# Altium footprint library Integrated Circuits.PcbLib: 40 footprints (part 1 of 3)
Each footprint in its own frame and in the unit in brackets; x right, y up, seen from the top. Pads: shape width x height; smd on the part's side, far side on the other; paste and mask are expansions set on the pad; w line width, h text height; cw(c..) or ccw(c..) is an arc to the next point about the centre after c.
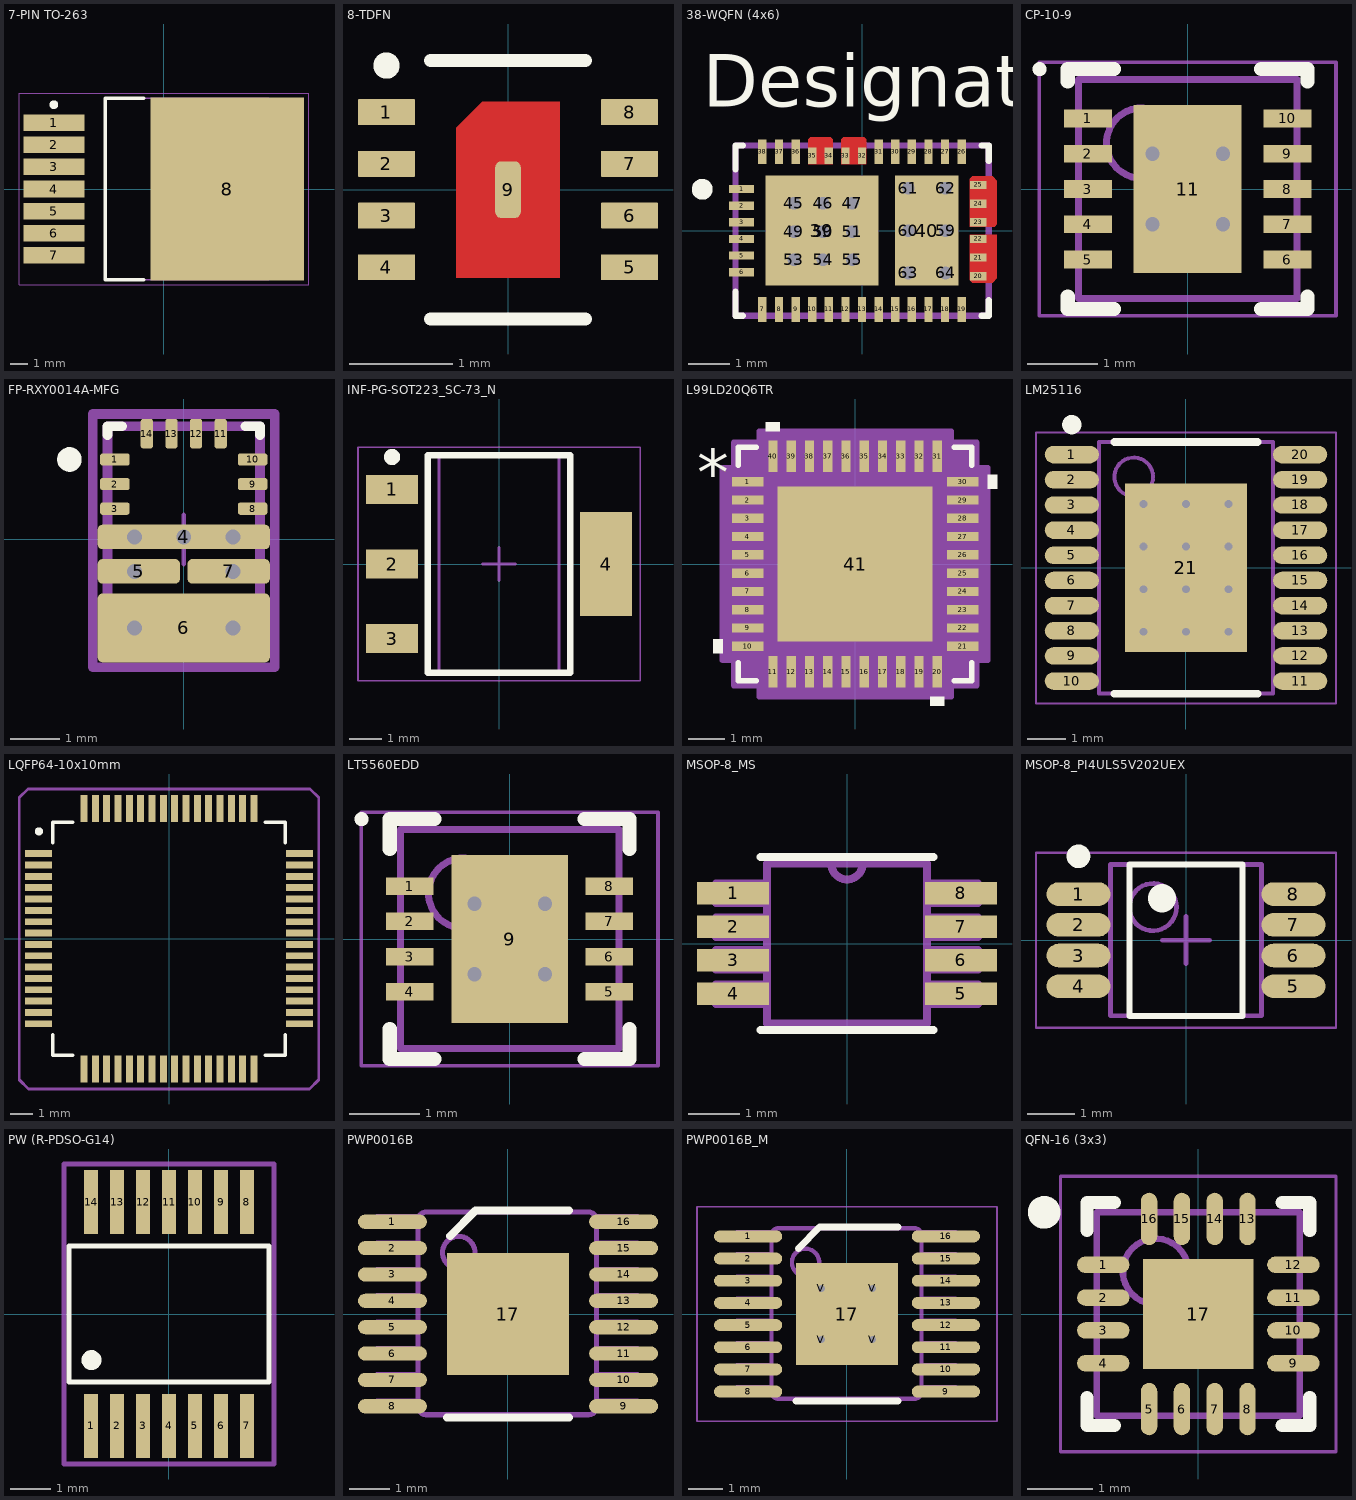
[diagram p0: the footprints below, top view; thin cyan lines are the x and y axes]

## 7-PIN TO-263 [mm] "DDPAK-7, 8-Pads, Body 7.80x8.57mm (max), IPC Medium Density"
height 4.65
pads (8):
  rect 3.5x0.95 smd: 1(-6.3,3.81) 2(-6.3,2.54) 3(-6.3,1.27) 4(-6.3,0) 5(-6.3,-1.27) 6(-6.3,-2.54) 7(-6.3,-3.81)
  rect 8.8x10.5 smd: 8(3.65,0)
Top Overlay:
  circle w0.25: c-6.3,4.835 r0.125
  lines w0.2: -1.15,-5.2 -3.35,-5.2 -3.35,5.2 -1.15,5.2
Mechanical 13:
  lines w0.1: -3.35,-5.2 -3.35,5.2 6.05,5.2 6.05,-5.2 -3.35,-5.2
Mechanical 15:
  lines w0.05: -8.3,-5.5 -8.3,5.5 8.3,5.5 8.3,-5.5 -8.3,-5.5
  lines w0.1: -0.5,0 0.5,0 ; 0,-0.5 0,0.5
3D body "7-PIN TO-263.step": height 4.65, standoff 0, extent -7.447,-5.2 7.793,5.2

## 8-TDFN [mm] "8 Pin DFN Package (2.5x2.5)"
pads (9):
  rrect5% 0.55x0.25 smd: 1(-1.175,0.75) 2(-1.175,0.25) 3(-1.175,-0.25) 4(-1.175,-0.75) 5(1.175,-0.75) 6(1.175,-0.25) 7(1.175,0.25) 8(1.175,0.75)
  rrect50% 0.25x0.55 smd: 9(0,0)
Top Layer:
  region: 0.5,-0.85 -0.5,-0.85 -0.5,0.6 -0.25,0.85 0.5,0.85
Top Overlay:
  circle w0.128: c-1.175,1.2 r0.064
  lines w0.127: -0.75,-1.25 0.75,-1.25 ; -0.75,1.25 0.75,1.25
3D body "User Library-DFN8 2_5x2_5mm.STEP": height 1.02, standoff 0, extent -1.26,-1.25 1.26,1.25

## 38-WQFN (4x6) [mm] "TPS25750DRJKR"
pads (55):
  rect 0.6x0.2 smd paste+0 mask-0.292: 1(-2.9,1) 2(-2.9,0.6) 3(-2.9,0.2) 4(-2.9,-0.2) 5(-2.9,-0.6) 6(-2.9,-1)
  rect 0.2x0.6 smd paste+0 mask-0.292: 7(-2.4,-1.9) 8(-2,-1.9) 9(-1.6,-1.9) 10(-1.2,-1.9) 11(-0.8,-1.9) 12(-0.4,-1.9) 13(0,-1.9) 14(0.4,-1.9) 15(0.8,-1.9) 16(1.2,-1.9) 17(1.6,-1.9) 18(2,-1.9) 19(2.4,-1.9) 26(2.4,1.9) 27(2,1.9) 28(1.6,1.9) 29(1.2,1.9) 30(0.8,1.9) 31(0.4,1.9) 36(-1.6,1.9) 37(-2,1.9) 38(-2.4,1.9)
  rect 0.4x0.2 smd paste-0.187 mask-0.191: 20(2.8,-1.1) 21(2.8,-0.65) 22(2.8,-0.2) 23(2.8,0.2) 24(2.8,0.65) 25(2.8,1.1)
  rect 0.2x0.4 smd paste-0.187 mask-0.191: 32(0,1.8) 33(-0.4,1.8) 34(-0.8,1.8) 35(-1.2,1.8)
  rect 2.72x2.65 smd paste-1.347 mask-1.346: 39(-0.965,0)
  rect 1.53x2.65 smd paste-1.312 mask-1.308: 40(1.56,0)
  round 0.6 / inner round 1.524 / far side round 0.6 hole 0.305 paste-2539.97 mask+0: 45(-1.64,0.655) 46(-0.94,0.655) 47(-0.24,0.655) 49(-1.64,-0.025) 50(-0.94,-0.025) 51(-0.24,-0.025) 53(-1.64,-0.705) 54(-0.94,-0.705) 55(-0.24,-0.705) 59(2.01,0) 60(1.11,0) 61(1.11,1.02) 62(2.01,1.02) 63(1.11,-1.02) 64(2.01,-1.02)
Top Layer:
  region: 2.597,0.096 2.597,1.25 2.65,1.303 3.15,1.303 3.25,1.203 3.25,0.15 3.196,0.096 2.901,0.096
  region: 2.591,-1.191 2.591,-0.097 3.25,-0.097 3.25,-1.15 3.15,-1.25 2.65,-1.25
  region: -1.3,1.6 -1.3,2.2 -1.25,2.25 -0.75,2.25 -0.7,2.2 -0.7,1.6
  region: -0.5,1.6 -0.5,2.2 -0.45,2.25 0.05,2.25 0.1,2.2 0.1,1.6
Top Overlay:
  circle w0.25: c-3.85,0.994 r0.125
  lines w0.15: -3.05,-1.475 -3.05,-2.05 -2.875,-2.05 ; -3.05,1.475 -3.05,2.05 -2.875,2.05 ; 2.875,-2.05 3.05,-2.05 3.05,-1.678 ; 2.875,2.05 3.05,2.05 3.05,1.678
  text "Designator565" at -3.835,2.984 h1.27
Top Paste:
  region: 3.15,0.1 2.9,0.1 2.65,0.1 2.6,0.15 2.6,1.203 2.65,1.253 3.15,1.253 3.2,1.203 3.2,1.05 3.15,1 2.925,1 2.875,0.95 2.875,0.8 2.925,0.75 3.15,0.75 3.2,0.7 3.2,0.6 3.15,0.55 2.925,0.55 2.875,0.5 2.875,0.35 2.925,0.3 3.15,0.3 3.2,0.25 3.2,0.15
  region: 3.15,-0.1 2.9,-0.1 2.65,-0.1 2.6,-0.15 2.6,-1.203 2.65,-1.253 3.15,-1.253 3.2,-1.203 3.2,-1.05 3.15,-1 2.925,-1 2.875,-0.95 2.875,-0.8 2.925,-0.75 3.15,-0.75 3.2,-0.7 3.2,-0.6 3.15,-0.55 2.925,-0.55 2.875,-0.5 2.875,-0.35 2.925,-0.3 3.15,-0.3 3.2,-0.25 3.2,-0.15
  region: -0.1,2.15 -0.05,2.2 0.05,2.2 0.1,2.15 0.1,1.65 0.05,1.6 -0.45,1.6 -0.5,1.65 -0.5,2.15 -0.45,2.2 -0.35,2.2 -0.3,2.15 -0.3,1.925 -0.25,1.875 -0.15,1.875 -0.1,1.925
  region: -0.9,2.15 -0.85,2.2 -0.75,2.2 -0.7,2.15 -0.7,1.65 -0.75,1.6 -1.25,1.6 -1.3,1.65 -1.3,2.15 -1.25,2.2 -1.15,2.2 -1.1,2.15 -1.1,1.925 -1.05,1.875 -0.95,1.875 -0.9,1.925
  region: -1.065,1.225 -1.065,0.155 -1.115,0.105 -2.215,0.105 -2.265,0.155 -2.265,1.225 -2.215,1.275 -1.115,1.275
  region: -2.265,-1.225 -2.265,-0.155 -2.215,-0.105 -1.115,-0.105 -1.065,-0.155 -1.065,-1.225 -1.115,-1.275 -2.215,-1.275
  region: 0.285,-1.275 -0.815,-1.275 -0.865,-1.225 -0.865,-0.155 -0.815,-0.105 0.285,-0.105 0.335,-0.155 0.335,-1.225
  region: 0.285,0.105 -0.815,0.105 -0.865,0.155 -0.865,1.225 -0.815,1.275 0.285,1.275 0.335,1.225 0.335,0.155
  region: 2.235,1.225 2.235,0.155 2.185,0.105 0.935,0.105 0.885,0.155 0.885,1.225 0.935,1.275 2.185,1.275
  region: 0.935,-0.105 2.185,-0.105 2.235,-0.155 2.235,-1.225 2.185,-1.275 0.935,-1.275 0.885,-1.225 0.885,-0.155
Top Solder:
  drawing of 34 lines, arcs and shapes, not listed
Mechanical 13:
  lines w0.15: -3.05,-2.05 3.05,-2.05 3.05,2.05 -3.05,2.05 -3.05,-2.05

## CP-10-9 [mm]
height 0.8
pads (11):
  rect 0.68x0.25 smd: 1(-1.415,1) 2(-1.415,0.5) 3(-1.415,0) 4(-1.415,-0.5) 5(-1.415,-1) 6(1.415,-1) 7(1.415,-0.5) 8(1.415,0) 9(1.415,0.5) 10(1.415,1)
  rect 1.53x2.38 smd: 11(0,0)
via -0.5,0.5 diameter 0.5 hole 0.2
via 0.5,0.5 diameter 0.5 hole 0.2
via -0.5,-0.5 diameter 0.5 hole 0.2
via 0.5,-0.5 diameter 0.5 hole 0.2
Top Overlay:
  circle w0.1: c-2.1,1.7 r0.05
  lines w0.2: -1.7,-1.525 -1.7,-1.7 -1.045,-1.7 ; -1.7,1.525 -1.7,1.7 -1.045,1.7 ; 1.045,-1.7 1.7,-1.7 1.7,-1.525 ; 1.045,1.7 1.7,1.7 1.7,1.525
Mechanical 13:
  circle w0.1: c-0.65,0.65 r0.5
  lines w0.1: -1.55,-1.55 -1.55,1.55 1.55,1.55 1.55,-1.55 -1.55,-1.55
Mechanical 15:
  lines w0.05: -2.105,-1.8 -2.105,1.8 2.105,1.8 2.105,-1.8 -2.105,-1.8
  lines w0.1: -0.5,0 0.5,0 ; 0,-0.5 0,0.5
3D body "CP-10-9.step": height 0.8, standoff 0, extent -1.57,-1.55 1.57,1.55

## FP-RXY0014A-MFG [mm]
pads (14):
  rrect40% 0.6x0.25 smd paste+0 mask-1000: 1(-1.4,1.625) 2(-1.4,1.125) 3(-1.4,0.625) 8(1.4,0.625) 9(1.4,1.125) 10(1.4,1.625)
  rrect40% 3.5x0.5 smd paste-1000 mask-1000: 4(0,0.05)
  rrect40% 1.675x0.5 smd paste-1000 mask-1000: 5(-0.913,-0.65) 7(0.913,-0.65)
  rrect14% 3.5x1.4 smd paste-1000 mask-1000: 6(0,-1.8)
  rrect40% 0.25x0.6 smd paste+0 mask-1000: 11(0.75,2.15) 12(0.25,2.15) 13(-0.25,2.15) 14(-0.75,2.15)
via 1,-1.8 diameter 0.5 hole 0.3
via -1,-0.65 diameter 0.5 hole 0.3
via -1,-1.8 diameter 0.5 hole 0.3
via 1,-0.65 diameter 0.5 hole 0.3
via 1,0.05 diameter 0.5 hole 0.3
via 0,0.05 diameter 0.5 hole 0.3
via -1,0.05 diameter 0.5 hole 0.3
Top Overlay:
  circle w0.25: c-2.325,1.625 r0.125
  lines w0.2: -1.55,2.125 -1.55,2.3 -1.25,2.3 ; 1.25,2.3 1.55,2.3 1.55,2.125
Top Paste:
  drawing of 10 lines, arcs and shapes, not listed
Top Solder:
  drawing of 14 lines, arcs and shapes, not listed
Top 3D Body:
  lines w0.2: -1.55,-2.3 -1.55,2.3 1.55,2.3 1.55,-2.3 -1.55,-2.3
Top Assembly:
  lines w0.2: -1.85,-2.6 -1.85,2.55 1.85,2.55 1.85,-2.6 -1.85,-2.6
  text ".Designator" at 0,0.162 h1
Top Courtyard:
  lines w0.2: -1.85,-2.6 -1.85,2.55 1.85,2.55 1.85,-2.6 -1.85,-2.6
Top Component Center:
  lines w0.1: -0.5,0 0.5,0 ; 0,-0.5 0,0.5
3D body "IC_Texas_Instruments_DRV8243HQRXYRQ1_eec.STEP": height 0.25, standoff 0, extent -1.85,-2.6 1.85,2.55

## INF-PG-SOT223_SC-73_N [mm] "SOT223, 4-Leads, Body 6.5x3.5mm, Pitch 2.3mm, IPC Medium Density"
height 1.8
pads (4):
  rect 1.6x0.9 smd: 1(-3.3,2.3) 2(-3.3,0) 3(-3.3,-2.3)
  rect 1.6x3.2 smd: 4(3.3,0)
Top Overlay:
  circle w0.25: c-3.3,3.3 r0.125
  lines w0.2: -2.2,-3.35 -2.2,3.35 2.2,3.35 2.2,-3.35 -2.2,-3.35
Mechanical 13:
  lines w0.1: -1.85,-3.35 -1.85,3.35 1.85,3.35 1.85,-3.35 -1.85,-3.35
Mechanical 15:
  lines w0.05: -4.35,-3.6 -4.35,3.6 4.35,3.6 4.35,-3.6 -4.35,-3.6
  lines w0.1: -0.5,0 0.5,0 ; 0,-0.5 0,0.5
3D body: height 1.8, standoff 0.1, extent -1.85,-3.35 1.85,3.35

## L99LD20Q6TR [mil] "IC LED DRVR RGLTR PWM 1.5A 40QFN"
pads (41):
  rect 34x10 smd paste+0 mask+0: 1(-116,88.61) 2(-116,68.92) 3(-116,49.23) 4(-116,29.54) 5(-116,9.85) 6(-116,-9.85) 7(-116,-29.54) 8(-116,-49.23) 9(-116,-68.92) 10(-116,-88.61) 21(116,-88.61) 22(116,-68.92) 23(116,-49.23) 24(116,-29.54) 25(116,-9.85) 26(116,9.85) 27(116,29.54) 28(116,49.23) 29(116,68.92) 30(116,88.61)
  rect 10x34 smd paste+0 mask+0: 11(-88.61,-116) 12(-68.92,-116) 13(-49.23,-116) 14(-29.54,-116) 15(-9.85,-116) 16(9.85,-116) 17(29.54,-116) 18(49.23,-116) 19(68.92,-116) 20(88.61,-116) 31(88.61,116) 32(68.92,116) 33(49.23,116) 34(29.54,116) 35(9.85,116) 36(-9.85,116) 37(-29.54,116) 38(-49.23,116) 39(-68.92,116) 40(-88.61,116)
  rect 167x167 smd paste-83 mask+0: 41(0,0)
Top Overlay:
  region: -143,-81.11 -153,-81.11 -153,-96.11 -143,-96.11
  region: 96.11,-143 81.11,-143 81.11,-153 96.11,-153
  region: 143,96.11 153,96.11 153,81.11 143,81.11
  region: -81.11,143 -96.11,143 -96.11,153 -81.11,153
  lines w6: -126,-106.7 -126,-126 -106.7,-126 ; -126,106.7 -126,126 -106.7,126 ; 106.7,-126 126,-126 126,-106.7 ; 106.7,126 126,126 126,106.7
  text "*" at -170.5,73.45 h50
Top Paste:
  region: -31.77,79.56 -79.56,79.56 -79.56,31.77 -31.77,31.77
  region: -31.77,23.9 -79.56,23.9 -79.56,-23.9 -31.77,-23.9
  region: -31.77,-31.77 -79.56,-31.77 -79.56,-79.56 -31.77,-79.56
  region: 23.9,79.56 -23.9,79.56 -23.9,31.77 23.9,31.77
  region: 23.9,23.9 -23.9,23.9 -23.9,-23.9 23.9,-23.9
  region: 23.9,-31.77 -23.9,-31.77 -23.9,-79.56 23.9,-79.56
  region: 79.56,79.56 31.77,79.56 31.77,31.77 79.56,31.77
  region: 79.56,23.9 31.77,23.9 31.77,-23.9 79.56,-23.9
  region: 79.56,-31.77 31.77,-31.77 31.77,-79.56 79.56,-79.56
Mechanical 13:
  lines w1: -121,71 -71,121 ; -121,-121 121,-121 121,121 -121,121 -121,-121 ; -121,-94.61 -121,-82.61 -121,-94.61 ; -121,-74.92 -121,-62.91 -121,-74.92 ; -121,-55.23 -121,-43.23 -121,-55.23 ; -121,-35.53 -121,-23.54 -121,-35.53 ; -121,-15.85 -121,-3.85 -121,-15.85 ; -121,3.85 -121,15.85 -121,3.85 ; -121,23.54 -121,35.53 -121,23.54 ; -121,43.23 -121,55.23 -121,43.23 ; -121,62.91 -121,74.92 -121,62.91 ; -121,82.61 -121,94.61 -121,82.61 ; -94.61,-121 -82.61,-121 -94.61,-121 ; -94.61,121 -82.61,121 -94.61,121 ; -74.92,-121 -62.91,-121 -74.92,-121 ; -74.92,121 -62.91,121 -74.92,121 ; -55.23,-121 -43.23,-121 -55.23,-121 ; -55.23,121 -43.23,121 -55.23,121 ; -35.53,-121 -23.54,-121 -35.53,-121 ; -35.53,121 -23.54,121 -35.53,121 ; -15.85,-121 -3.85,-121 -15.85,-121 ; -15.85,121 -3.85,121 -15.85,121 ; 3.85,-121 15.85,-121 3.85,-121 ; 3.85,121 15.85,121 3.85,121 ; 23.54,-121 35.53,-121 23.54,-121 ; 23.54,121 35.53,121 23.54,121 ; 43.23,-121 55.23,-121 43.23,-121 ; 43.23,121 55.23,121 43.23,121 ; 62.91,-121 74.92,-121 62.91,-121 ; 62.91,121 74.92,121 62.91,121 ; 82.61,-121 94.61,-121 82.61,-121 ; 82.61,121 94.61,121 82.61,121 ; 121,-94.61 121,-82.61 121,-94.61 ; 121,-74.92 121,-62.91 121,-74.92 ; 121,-55.23 121,-43.23 121,-55.23 ; 121,-35.53 121,-23.54 121,-35.53 ; 121,-15.85 121,-3.85 121,-15.85 ; 121,3.85 121,15.85 121,3.85 ; 121,23.54 121,35.53 121,23.54 ; 121,43.23 121,55.23 121,43.23 ; 121,62.91 121,74.92 121,62.91 ; 121,82.61 121,94.61 121,82.61
  text "*" at -111.5,73.45 h50
Mechanical 15:
  region: -103.61,-131 -131,-131 -131,-103.61 -143,-103.61 -143,103.61 -131,103.61 -131,131 -103.61,131 -103.61,143 103.61,143 103.61,131 131,131 131,103.61 143,103.61 143,-103.61 131,-103.61 131,-131 103.61,-131 103.61,-143 -103.61,-143
  lines w6: -143,-103.61 -131,-103.61 -131,-131 -103.61,-131 -103.61,-143 103.61,-143 103.61,-131 131,-131 131,-103.61 143,-103.61 143,103.61 131,103.61 131,131 103.61,131 103.61,143 -103.61,143 -103.61,131 -131,131 -131,103.61 -143,103.61 -143,-103.61
3D body "QFN40L_6P15X6P15X0P5_STM.step": height 41.1, standoff 0, extent -120.98,-120.98 120.98,120.98

## LM25116 [mm] "IC REG CTRLR BUCK 20TSSOP"
height 1.1
pads (21):
  oval 1.4x0.45 smd: 1(-2.95,2.925) 2(-2.95,2.275) 3(-2.95,1.625) 4(-2.95,0.975) 5(-2.95,0.325) 6(-2.95,-0.325) 7(-2.95,-0.975) 8(-2.95,-1.625) 9(-2.95,-2.275) 10(-2.95,-2.925) 11(2.95,-2.925) 12(2.95,-2.275) 13(2.95,-1.625) 14(2.95,-0.975) 15(2.95,-0.325) 16(2.95,0.325) 17(2.95,0.975) 18(2.95,1.625) 19(2.95,2.275) 20(2.95,2.925)
  rect 3.15x4.35 smd: 21(0,0)
via -1.1,1.65 diameter 0.5 hole 0.2
via 0,1.65 diameter 0.5 hole 0.2
via 1.1,1.65 diameter 0.5 hole 0.2
via -1.1,0.55 diameter 0.5 hole 0.2
via 0,0.55 diameter 0.5 hole 0.2
via 1.1,0.55 diameter 0.5 hole 0.2
via -1.1,-0.55 diameter 0.5 hole 0.2
via 0,-0.55 diameter 0.5 hole 0.2
via 1.1,-0.55 diameter 0.5 hole 0.2
via -1.1,-1.65 diameter 0.5 hole 0.2
via 0,-1.65 diameter 0.5 hole 0.2
via 1.1,-1.65 diameter 0.5 hole 0.2
Top Overlay:
  circle w0.25: c-2.95,3.7 r0.125
  lines w0.2: -1.85,-3.25 1.85,-3.25 ; -1.85,3.25 1.85,3.25
Mechanical 13:
  circle w0.1: c-1.35,2.35 r0.5
  lines w0.1: -2.25,-3.25 -2.25,3.25 2.25,3.25 2.25,-3.25 -2.25,-3.25
Mechanical 15:
  lines w0.05: -3.875,-3.5 -3.875,3.5 3.875,3.5 3.875,-3.5 -3.875,-3.5
  lines w0.1: -0.5,0 0.5,0 ; 0,-0.5 0,0.5
3D body "LM25116.step": height 1.1, standoff 0, extent -3.2,-3.25 3.2,3.25

## LQFP64-10x10mm [mm]
pads (64):
  rect 1.194x0.305 smd paste+0 mask+0.102: 1(-5.75,3.75) 2(-5.75,3.25) 3(-5.75,2.75) 4(-5.75,2.25) 5(-5.75,1.75) 6(-5.75,1.25) 7(-5.75,0.75) 8(-5.75,0.25) 9(-5.75,-0.25) 10(-5.75,-0.75) 11(-5.75,-1.25) 12(-5.75,-1.75) 13(-5.75,-2.25) 14(-5.75,-2.75) 15(-5.75,-3.25) 16(-5.75,-3.75) 33(5.75,-3.75) 34(5.75,-3.25) 35(5.75,-2.75) 36(5.75,-2.25) 37(5.75,-1.75) 38(5.75,-1.25) 39(5.75,-0.75) 40(5.75,-0.25) 41(5.75,0.25) 42(5.75,0.75) 43(5.75,1.25) 44(5.75,1.75) 45(5.75,2.25) 46(5.75,2.75) 47(5.75,3.25) 48(5.75,3.75)
  rect 0.305x1.194 smd paste+0 mask+0.102: 17(-3.75,-5.75) 18(-3.25,-5.75) 19(-2.75,-5.75) 20(-2.25,-5.75) 21(-1.75,-5.75) 22(-1.25,-5.75) 23(-0.75,-5.75) 24(-0.25,-5.75) 25(0.25,-5.75) 26(0.75,-5.75) 27(1.25,-5.75) 28(1.75,-5.75) 29(2.25,-5.75) 30(2.75,-5.75) 31(3.25,-5.75) 32(3.75,-5.75) 49(3.75,5.75) 50(3.25,5.75) 51(2.75,5.75) 52(2.25,5.75) 53(1.75,5.75) 54(1.25,5.75) 55(0.75,5.75) 56(0.25,5.75) 57(-0.25,5.75) 58(-0.75,5.75) 59(-1.25,5.75) 60(-1.75,5.75) 61(-2.25,5.75) 62(-2.75,5.75) 63(-3.25,5.75) 64(-3.75,5.75)
Top Overlay:
  circle w0.254: c-5.738,4.735 r0.051
  lines w0.152: -5.131,-4.234 -5.131,-5.131 -4.234,-5.131 ; -5.131,4.234 -5.131,5.131 -4.234,5.131 ; 4.234,-5.131 5.131,-5.131 5.131,-4.234 ; 4.234,5.131 5.131,5.131 5.131,4.234
Boundary:
  lines w0.127: -6.604,-6.223 -6.198,-6.629 6.198,-6.629 6.604,-6.223 6.604,6.223 6.223,6.604 -6.223,6.604 -6.604,6.223 -6.604,-6.223
3D body: height 0.25, standoff 0, extent 0,0 0.254,0.254
3D body "LQFP64-10x10mm.step": height 1.6, standoff 0, extent -5.997,-5.997 5.997,5.997

## LT5560EDD [mm] "SON, 8-Leads, Body 3.00x3.00mm, Pitch 0.50mm, Thermal Pad 2.38x1.53mm, IPC Medium Density (8-DFN EP)"
height 2.65
pads (9):
  rect 0.675x0.25 smd: 1(-1.415,0.75) 2(-1.415,0.25) 3(-1.415,-0.25) 4(-1.415,-0.75) 5(1.415,-0.75) 6(1.415,-0.25) 7(1.415,0.25) 8(1.415,0.75)
  rect 1.65x2.38 smd: 9(0,0)
via -0.5,0.5 diameter 0.5 hole 0.2
via 0.5,0.5 diameter 0.5 hole 0.2
via -0.5,-0.5 diameter 0.5 hole 0.2
via 0.5,-0.5 diameter 0.5 hole 0.2
Top Overlay:
  circle w0.1: c-2.1,1.7 r0.05
  lines w0.2: -1.7,-1.275 -1.7,-1.7 -1.065,-1.7 ; -1.7,1.275 -1.7,1.7 -1.065,1.7 ; 1.065,-1.7 1.7,-1.7 1.7,-1.275 ; 1.065,1.7 1.7,1.7 1.7,1.275
Mechanical 13:
  circle w0.1: c-0.65,0.65 r0.5
  lines w0.1: -1.55,-1.55 -1.55,1.55 1.55,1.55 1.55,-1.55 -1.55,-1.55
Mechanical 15:
  lines w0.05: -2.105,-1.8 -2.105,1.8 2.105,1.8 2.105,-1.8 -2.105,-1.8
  lines w0.1: -0.5,0 0.5,0 ; 0,-0.5 0,0.5
3D body: height 2.65, standoff 0, extent -1.55,-1.55 1.55,1.55

## MSOP-8_MS [mil]
pads (8):
  rect 55x17 smd: 1(-87,38.39) 2(-87,12.8) 3(-87,-12.8) 4(-87,-38.39) 5(87,-38.39) 6(87,-12.8) 7(87,12.8) 8(87,38.39)
Top Overlay:
  lines w6: -66,-66 66,-66 ; -66,66 66,66
Mechanical 13:
  lines w6: -12,61 ccw(c0,61) 12,61 ; -12,61 -61,61 -61,-61 61,-61 61,61 12,61 ; -12,61 12,61 ; -100,-46 -61,-46 -61,-31 -100,-31 -100,-46 ; -100,-20 -61,-20 -61,-5 -100,-5 -100,-20 ; -100,5 -61,5 -61,20 -100,20 -100,5 ; -100,31 -61,31 -61,46 -100,46 -100,31 ; 61,-46 100,-46 100,-31 61,-31 61,-46 ; 61,-20 100,-20 100,-5 61,-5 61,-20 ; 61,5 100,5 100,20 61,20 61,5 ; 61,31 100,31 100,46 61,46 61,31

## MSOP-8_PI4ULS5V202UEX [mm] "TSOP, 8-Leads, Body 3.00x3.00mm, Pitch 0.65mm, IPC Medium Density"
height 1.1
pads (8):
  oval 1.35x0.5 smd: 1(-2.275,0.975) 2(-2.275,0.325) 3(-2.275,-0.325) 4(-2.275,-0.975) 5(2.275,-0.975) 6(2.275,-0.325) 7(2.275,0.325) 8(2.275,0.975)
Top Overlay:
  circle w0.25: c-2.275,1.775 r0.125
  lines w0.127: -1.2,-1.6 1.2,-1.6 1.2,1.6 -1.2,1.6 -1.2,-1.6
  lines w0.6: -0.508,0.888 ccw(c-0.808,0.889) -0.508,0.889
Mechanical 13:
  circle w0.1: c-0.7,0.7 r0.5
  lines w0.1: -1.6,-1.6 1.6,-1.6 1.6,1.6 -1.6,1.6 -1.6,-1.6
Mechanical 15:
  lines w0.05: -3.175,-1.85 3.175,-1.85 3.175,1.85 -3.175,1.85 -3.175,-1.85
  lines w0.1: -0.5,0 0.5,0 ; 0,-0.5 0,0.5
3D body "User Library-MSOP8.STEP": height 1.06, standoff -0.04, extent -2.469,-1.55 2.469,1.55

## PW (R-PDSO-G14) [mm] "TI 14-TSSOP Package"
pads (14):
  rect 0.35x1.6 smd: 1(-1.95,-2.8) 2(-1.3,-2.8) 3(-0.65,-2.8) 4(0,-2.8) 5(0.65,-2.8) 6(1.3,-2.8) 7(1.95,-2.8) 8(1.95,2.8) 9(1.3,2.8) 10(0.65,2.8) 11(0,2.8) 12(-0.65,2.8) 13(-1.3,2.8) 14(-1.95,2.8)
Top Overlay:
  circle w0.25: c-1.939,-1.152 r0.125
  lines w0.127: -2.5,-1.7 2.5,-1.7 2.5,1.7 -2.5,1.7 -2.5,-1.7
Mechanical 15:
  lines w0.127: -2.625,-3.75 2.625,-3.75 2.625,3.75 -2.625,3.75 -2.625,-3.75
3D body "User Library-TPS61500PWPR.step": height 1.2, standoff 0, extent -2.55,-3.2 2.55,3.2

## PWP0016B [mm]
pads (17):
  oval 1.7x0.35 smd paste-0.102 mask+0.051: 1(-2.85,2.275) 2(-2.85,1.625) 3(-2.85,0.975) 4(-2.85,0.325) 5(-2.85,-0.325) 6(-2.85,-0.975) 7(-2.85,-1.625) 8(-2.85,-2.275) 9(2.85,-2.275) 10(2.85,-1.625) 11(2.85,-0.975) 12(2.85,-0.325) 13(2.85,0.325) 14(2.85,0.975) 15(2.85,1.625) 16(2.85,2.275)
  rect 3x3 smd paste-0.102 mask+0.051: 17(0,0)
Top Overlay:
  lines w0.2: -1.5,-2.55 1.5,-2.55 ; -1.425,1.925 -0.8,2.55 1.5,2.55
Top Paste:
  region: 0.1,-0.1 0.1,-1.4 1.4,-1.4 1.4,-0.1
  region: -0.1,-1.4 -0.1,-0.1 -1.4,-0.1 -1.4,-1.4
  region: -0.1,0.1 -0.1,1.4 -1.4,1.4 -1.4,0.1
  region: 0.1,1.4 0.1,0.1 1.4,0.1 1.4,1.4
Mechanical 13:
  drawing of 202 lines, arcs and shapes, not listed
Mechanical 15:
  lines w0.1: -0.5,-0.65 0.5,-0.65 ; 0,-1.15 0,-0.15
3D body "PWP0016B.STEP": height 1, standoff 0, extent -3.159,-2.505 3.262,2.495
3D body: height 0.25, standoff 0, extent 0,0 0.254,0.254

## PWP0016B_M [mm]
pads (21):
  oval 2x0.35 smd paste-0.102 mask+0.051: 1(-2.9,2.275) 2(-2.9,1.625) 3(-2.9,0.975) 4(-2.9,0.325) 5(-2.9,-0.325) 6(-2.9,-0.975) 7(-2.9,-1.625) 8(-2.9,-2.275) 9(2.9,-2.275) 10(2.9,-1.625) 11(2.9,-0.975) 12(2.9,-0.325) 13(2.9,0.325) 14(2.9,0.975) 15(2.9,1.625) 16(2.9,2.275)
  rect 3x3 smd paste-0.102 mask+0.051: 17(0,0)
  round 0.4 hole 0.203 mask+0.051: V(-0.75,-0.75) V(-0.75,0.75) V(0.75,-0.75) V(0.75,0.75)
Top Overlay:
  lines w0.2: -1.5,-2.55 1.5,-2.55 ; -1.425,1.925 -0.8,2.55 1.5,2.55
Top Paste:
  region: 0.1,1.4 0.1,0.1 1.4,0.1 1.4,1.4
  region: -0.1,0.1 -0.1,1.4 -1.4,1.4 -1.4,0.1
  region: -0.1,-1.4 -0.1,-0.1 -1.4,-0.1 -1.4,-1.4
  region: 0.1,-0.1 0.1,-1.4 1.4,-1.4 1.4,-0.1
Mechanical 13:
  drawing of 202 lines, arcs and shapes, not listed
  text ".Designator" at -1.85,-1.135 h1.27
Mechanical 15:
  lines w0.05: -4.4,-3.15 4.4,-3.15 4.4,3.15 -4.4,3.15 -4.4,-3.15
  lines w0.1: -0.5,-0.65 0.5,-0.65 ; 0,-1.15 0,-0.15
3D body: height 0.25, standoff 0, extent 0,0 0.254,0.254

## QFN-16 (3x3) [mm] "QFN, 16-Leads, Body 3.00x3.00mm, Pitch 0.50mm, Thermal Pad 1.68x1.68mm, IPC Medium Density"
height 1
pads (17):
  oval 0.8x0.25 smd: 1(-1.45,0.75) 2(-1.45,0.25) 3(-1.45,-0.25) 4(-1.45,-0.75) 9(1.45,-0.75) 10(1.45,-0.25) 11(1.45,0.25) 12(1.45,0.75)
  oval 0.25x0.8 smd: 5(-0.75,-1.45) 6(-0.25,-1.45) 7(0.25,-1.45) 8(0.75,-1.45) 13(0.75,1.45) 14(0.25,1.45) 15(-0.25,1.45) 16(-0.75,1.45)
  rect 1.68x1.68 smd: 17(0,0)
Top Overlay:
  circle w0.25: c-2.35,1.55 r0.125
  lines w0.2: -1.7,-1.275 -1.7,-1.7 -1.275,-1.7 ; -1.7,1.275 -1.7,1.7 -1.275,1.7 ; 1.275,-1.7 1.7,-1.7 1.7,-1.275 ; 1.275,1.7 1.7,1.7 1.7,1.275
Mechanical 13:
  circle w0.1: c-0.65,0.65 r0.5
  lines w0.1: -1.55,-1.55 -1.55,1.55 1.55,1.55 1.55,-1.55 -1.55,-1.55
Mechanical 15:
  lines w0.05: -2.1,-2.1 -2.1,2.1 2.1,2.1 2.1,-2.1 -2.1,-2.1
  lines w0.1: -0.5,0 0.5,0 ; 0,-0.5 0,0.5
3D body: height 1, standoff 0, extent -1.55,-1.55 1.55,1.55